# Altium footprint library LHAC-4XDSP2XV7-VP5_0226_3.PcbLib: 96 footprints (part 11 of 12)
Each footprint in its own frame and in the unit in brackets; x right, y up, seen from the top. Pads: shape width x height; smd on the part's side, far side on the other; paste and mask are expansions set on the pad; w line width, h text height; cw(c..) or ccw(c..) is an arc to the next point about the centre after c.
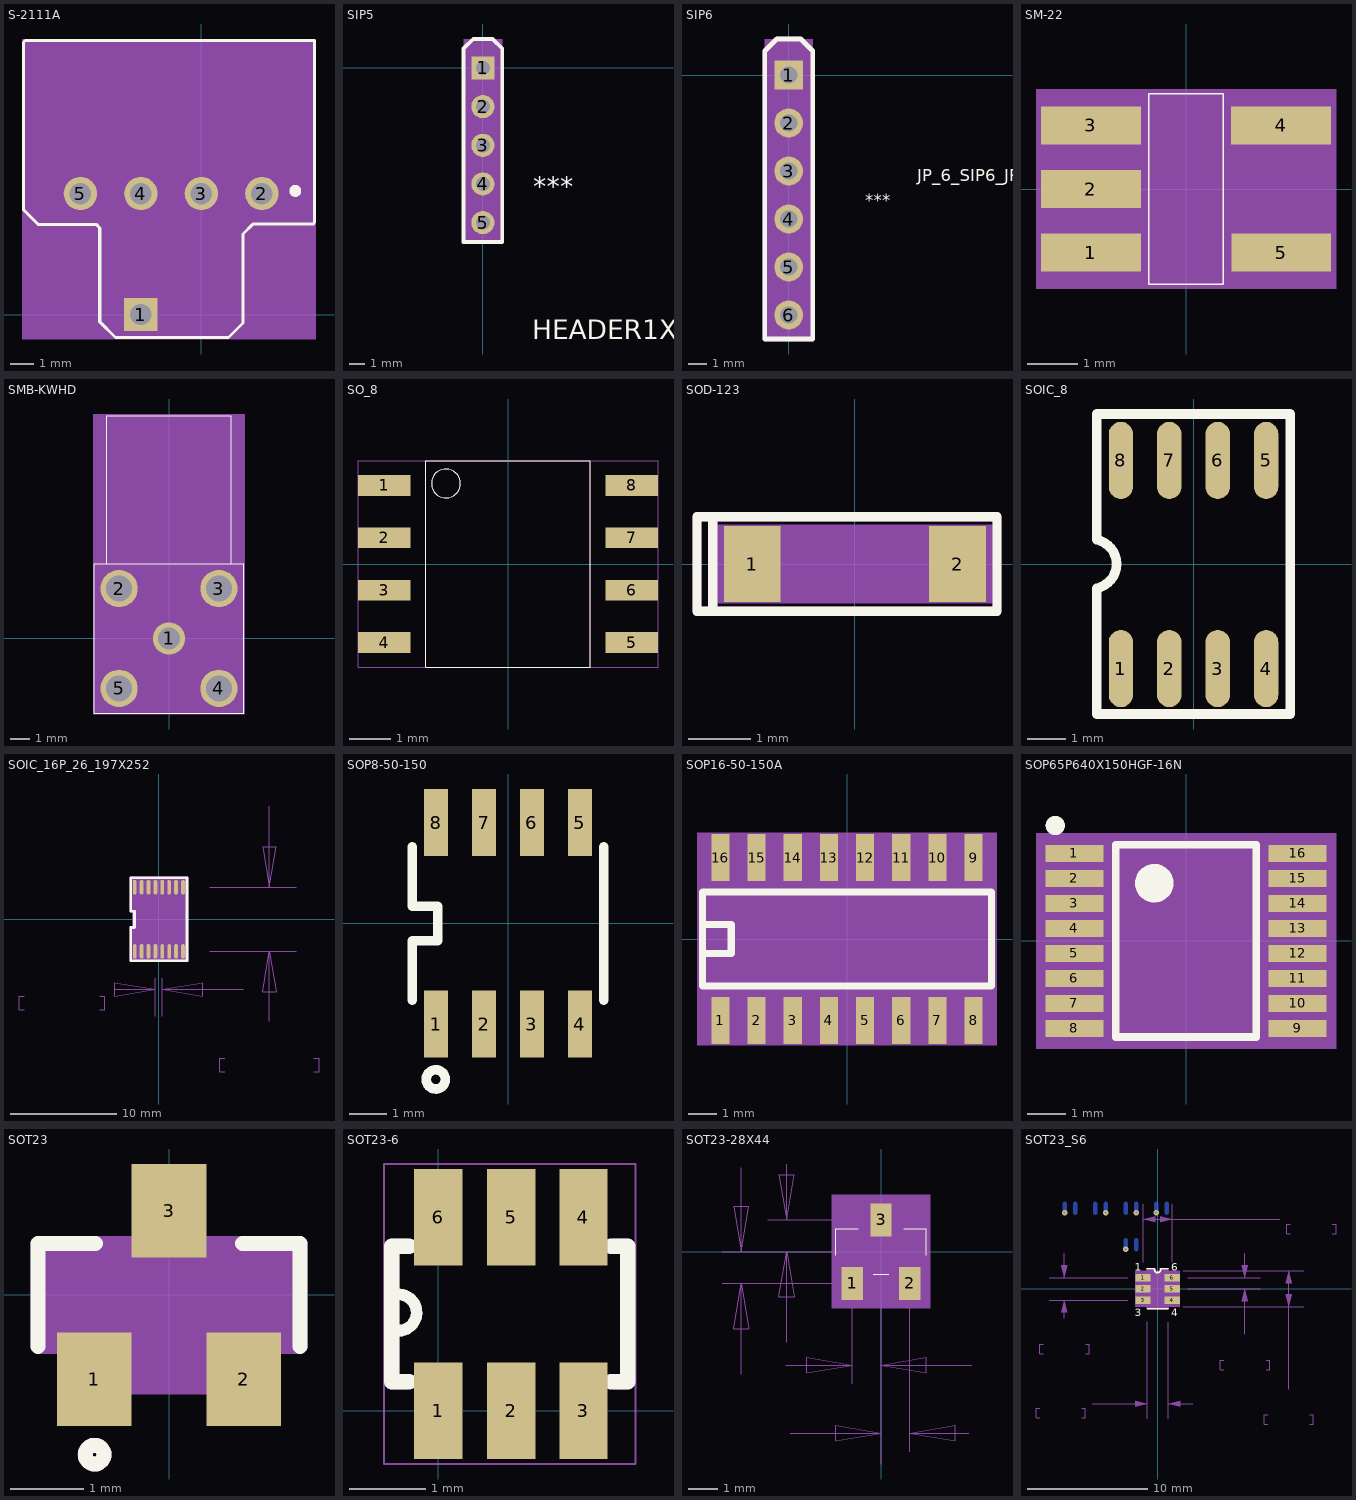
[diagram p10: the footprints below, top view; thin cyan lines are the x and y axes]

## S-2111A [mil] "S-2111A"
pads (5):
  rect 55.12x55.12 hole 35.43: 1(-100,0)
  round 55.12 hole 35.43: 2(100,200) 3(0,200) 4(-100,200) 5(-200,200)
Top Overlay:
  circle w9.84: c155.14,204.39 r4.92
  lines w5: -294,173 -294,450 -291,453 187,453 187,152 185,150 86,150 69,133 69,-14 45,-38 -1,-38 -142,-38 -168,-12 -168,143 -174,149 -270,149 -294,173
Mechanical 5:
  circle w9.84: c155.14,204.39 r4.92
  lines w5: -294,173 -294,450 -291,453 187,453 187,152 185,150 86,150 69,133 69,-14 45,-38 -1,-38 -142,-38 -168,-12 -168,143 -174,149 -270,149 -294,173
  text "U41" at 112.55,39.84 h25
  text "S2111A_S-2111A_S-2011A" at -65,536 h25
Mechanical 14:
  text "3" at 0,210 h25
  text "5" at -200,210 h25
  text "2" at 100,210 h25
  text "1" at -100,10 h25
  text "4" at -100,210 h25
Mechanical 16:
  circle w3.94: c-200,200 r27.56
  circle w3.94: c-100,200 r27.56
  circle w3.94: c0,200 r27.56
  circle w3.94: c100,200 r27.56
  circle w1.97: c0,0 r13.78
  region: -296.5,-40.5 189.5,-40.5 189.5,455.5 -296.5,455.5
  lines w1.97: -19.69,0 19.69,0 ; 0,-19.69 0,19.69
  lines w3.94: -127.56,-27.56 -127.56,27.56 -72.44,27.56 -72.44,-27.56 -127.56,-27.56
Mechanical 17:
  text ".Designator" at -70.17,237.5 h25
3D body: height 150, standoff 0, extent -296.5,-40.5 189.5,455.5

## SIP5 [mil] "SIP5"
pads (5):
  rect 60x60 / inner rect 55x55 / far side rect 60x60 hole 36: 1(0,0)
  round 60 / inner round 55 / far side round 60 hole 36: 2(0,-100) 3(0,-200) 4(0,-300) 5(0,-400)
Top Overlay:
  lines w10: -50,-450 -50,50 -25,75 25,75 50,50 50,-450 -50,-450
  text ".Designator" at 97.5,-242.5 h25
  text "HEADER1X5_SIP5_HEADER1X5" at 128,-701 h50
  text "***" at 130,-332 h50
Mechanical 14:
  text "4" at 0,-324.8 h31
  text "2" at 0,-124.8 h31
  text "3" at 0,-224.8 h31
  text "1" at 0,-24.8 h31
  text "5" at 0,-424.8 h31
Mechanical 16:
  region: -50,-450 50,-450 50,75 -50,75
  lines w1: -50,-450 -50,50 -25,75 25,75 50,50 50,-450 -50,-450
Mechanical 17:
  text "***" at -21,-507 h50
3D body: height 150, standoff 0, extent -50,-450 50,75

## SIP6 [mil] "SIP6"
pads (6):
  rect 60x60 / inner rect 55x55 / far side rect 60x60 hole 36: 1(0,0)
  round 60 / inner round 55 / far side round 60 hole 36: 2(0,-100) 3(0,-200) 4(0,-300) 5(0,-400) 6(0,-500)
Top Overlay:
  lines w10: -50,-550 50,-550 50,50 25,75 -25,75 -50,50 -50,-550
  text "***" at 160,-272 h25
  text "JP_6_SIP6_JP_6" at 268,-221 h25
  text ".Designator" at 25,-570 h25
Mechanical 5:
  lines w10: -50,-550 50,-550 50,50 25,75 -25,75 -50,50 -50,-550
  text "J5" at 25.01,-570 h25
  text "JP_6_SIP6_JP_6" at 259.66,-212.66 h25
  text "***" at 186.66,-228.66 h25
Mechanical 14:
  text "2" at 8,-100 h10
  text "1" at 8,0 h10
  text "5" at 8,-400 h10
  text "3" at 8,-200 h10
  text "6" at 8,-500 h10
  text "4" at 8,-300 h10
Mechanical 16:
  region: -50,-550 50,-550 50,75 -50,75
  lines w1: -50,-550 50,-550 50,50 25,75 -25,75 -50,50 -50,-550
Mechanical 17:
  text "***" at 9,-447 h25
3D body: height 150, standoff 0, extent -50,-550 50,75

## SM-22 [mil] "SM-22"
pads (5):
  rect 78.7x29.9 smd: 1(-74.8,-50) 2(-74.8,0) 3(-74.8,50) 4(74.8,50) 5(75,-50)
Top Overlay:
  lines w1: -29.5,-75 -29.5,75 29.5,75 29.5,-75 -29.5,-75
Mechanical 5:
  lines w1: -29.5,-75 -29.5,75 29.5,75 29.5,-75 -29.5,-75
  text "T14" at 37.85,144.45 h25
Mechanical 14:
  text "1" at -66.8,-50 h20
  text "5" at 95,-50 h25
  text "3" at -66.8,50 h20
  text "2" at -66.8,0 h20
  text "4" at 82.8,50 h20
Mechanical 16:
  region: -118.1,78.7 -118.1,-78.7 118.1,-78.7 118.1,78.7
  lines w1: -29.6,59.9 -29.4,59.9 -14.4,74.8 ; -29.5,-75 -29.5,75 29.5,75 29.5,-75 -29.5,-75
3D body: height 150, standoff 0, extent -118.1,-78.7 118.1,78.7

## SMB-KWHD [mil] "SMB-KWHD"
pads (5):
  round 65 / inner round 55 / far side round 65 hole 44: 1(0,0)
  round 75 / inner round 65 / far side round 75 hole 52: 2(-100.39,100.39) 3(100.39,100.39) 4(100.39,-100.39) 5(-100.39,-100.39)
Top Overlay:
  lines w1: -125.39,150.47 -125.39,448.03 125.39,448.03 125.39,150.47 ; -150.59,-150.59 150.59,-150.59 150.59,150.59 -150.59,150.59 -150.59,-150.59
Mechanical 5:
  lines w1: -125.39,150.47 -125.39,448.03 125.39,448.03 125.39,150.47 ; -150.59,-150.59 150.59,-150.59 150.59,150.59 -150.59,150.59 -150.59,-150.59
  text "J10" at 175.05,9.55 h25
Mechanical 14:
  text "1" at 0,28 h35
  text "2" at -100.39,128.39 h35
  text "3" at 100.39,128.39 h35
  text "4" at 100.39,-72.39 h35
  text "5" at -100.39,-72.39 h35
Mechanical 16:
  region: -151.89,-151.89 151.89,-151.89 151.89,451.42 -151.89,451.42
  lines w1: -125.39,150.47 -125.39,451.42 ; -125.39,448.03 125.39,448.03 125.39,150.47 ; -150.59,-150.59 150.59,-150.59 150.59,150.59 -150.59,150.59 -150.59,-150.59
3D body: height 150, standoff 0, extent -151.89,-151.89 151.89,451.42

## SO_8 [mm] "SO_8"
pads (8):
  rect 1.27x0.5 smd: 1(-3,1.905) 2(-3,0.635) 3(-3,-0.635) 4(-3,-1.905) 5(3,-1.905) 6(3,-0.635) 7(3,0.635) 8(3,1.905)
Top Overlay:
  circle w0.025: c-1.506,1.954 r0.351
  lines w0.025: -2,-2.5 2,-2.5 2,2.5 -2,2.5 -2,-2.5
  text ".Designator" at -1.143,2.857 h0.64
Mechanical 5:
  lines w0.025: -2,-2.5 2,-2.5 2,2.5 -2,2.5 -2,-2.5 ; -1.857,1.954 ccw(c-1.506,1.954) -1.506,1.603 ccw(c-1.506,1.954) -1.155,1.954 ccw(c-1.506,1.954) -1.506,2.305 ccw(c-1.506,1.954) -1.857,1.954
  text "U8" at 1.058,1.926 h0.64
Mechanical 14:
  text "7" at 2.797,0.635 h0.51
  text "3" at -3.203,-0.635 h0.51
  text "4" at -3.203,-1.905 h0.51
  text "5" at 2.797,-1.905 h0.51
  text "2" at -3.203,0.635 h0.51
  text "8" at 2.797,1.905 h0.51
  text "1" at -3.203,1.905 h0.51
  text "6" at 2.797,-0.635 h0.51
Mechanical 16:
  lines w0.025: -3.64,-2.5 3.64,-2.5 ; -3.64,-2.5 -3.64,2.5 ; -3.64,-2.5 3.64,-2.5 ; -3.64,-2.5 -3.64,2.5 ; -3.64,2.5 3.64,2.5 ; -3.64,2.5 3.64,2.5 ; 3.64,-2.5 3.64,2.5 ; 3.64,-2.5 3.64,2.5 ; -2,-2.5 2,-2.5 2,2.5 -2,2.5 -2,-2.5

## SOD-123 [mil] "SOD-123"
pads (2):
  rect 36x48 smd: 1(-65,0) 2(65,0)
Top Overlay:
  lines w6: -90,-30 -90,30 ; -90,-30 90,-30 90,30 -90,30 ; -90,-30 -100,-30 -100,30 -90,30
Mechanical 5:
  lines w6: -90,-30 -100,-30 -100,30 -90,30 ; -90,-30 90,-30 90,30 -90,30 ; -90,-30 -90,30
  text "D1" at -142.5,17.5 h25
Mechanical 14:
  text "2" at 65,10 h25
  text "1" at -65,10 h25
Mechanical 16:
  region: -89,-25 89,-25 89,25 -89,25
  lines w1: -89,-18 89,-18 89,18 -89,18 -89,-18
Mechanical 17:
  text "MBR0530" at -100,-100 h60
3D body: height 150, standoff 0, extent -89,-25 89,25

## SOIC_8 [mil] "SOIC_8"
pads (8):
  oval 25.2x79.9 smd: 1(-75,-107.5) 2(-25,-107.5) 3(25,-107.5) 4(75,-107.5) 5(75,107.5) 6(25,107.5) 7(-25,107.5) 8(-75,107.5)
Top Overlay:
  lines w10: -100,-154.5 -100,-24.5 ccw(c-105.01,0.5) -100,25.5 -100,155.5 100,155.5 100,-154.5 -100,-154.5
Mechanical 17:
  text ".Designator" at -130,-220 h25

## SOIC_16P_26_197X252 [mil] "SOIC_16P_26_197X252"
pads (16):
  oval 14x54 smd: 1(-89.57,-118.98) 2(-63.98,-118.98) 3(-38.39,-118.98) 4(-12.8,-118.98) 5(12.8,-118.98) 6(38.39,-118.98) 7(63.98,-118.98) 8(89.57,-118.98) 9(89.57,118.98) 10(63.98,118.98) 11(38.39,118.98) 12(12.8,118.98) 13(-12.8,118.98) 14(-38.39,118.98) 15(-63.98,118.98) 16(-89.57,118.98)
Top Overlay:
  lines w10: -104.57,-153.98 -104.57,-30 -90,-30 -90,30 -104.57,30 -104.57,153.98 94.57,153.98 104.57,153.98 104.57,-143.98 104.57,-153.98 -94.57,-153.98 -104.57,-153.98
  text ".Designator" at 162.5,-12.5 h25
Mechanical 5:
  lines w10: -104.57,-153.98 -104.57,-30 -90,-30 -90,30 -104.57,30 -104.57,153.98 94.57,153.98 104.57,153.98 104.57,-143.98 104.57,-153.98 -94.57,-153.98 -104.57,-153.98
  text "U69" at 162.5,-12.5 h25
Mechanical 13:
  lines w1: -500,-335 -519,-335 -519,-285 -500,-285 ; -220,-335 -201,-335 -201,-285 -220,-285 ; -163.5,-260 -12.8,-260 ; -12.8,-360 -12.8,-218.98 ; 12.8,-360 12.8,-218.98 ; 189.57,-118.98 510,-118.98 ; 189.57,118.98 510,118.98 ; 244.5,-565 225.5,-565 225.5,-515 244.5,-515 ; 312.8,-260 12.8,-260 ; 410,-377.5 410,-118.98 ; 410,418.98 410,118.98 ; 575.5,-565 594.5,-565 594.5,-515 575.5,-515 ; -12.8,-260 -162.8,-235 -162.8,-285 -12.8,-260 ; 12.8,-260 162.8,-285 162.8,-235 12.8,-260 ; 410,-118.98 385,-268.98 435,-268.98 410,-118.98 ; 410,118.98 435,268.98 385,268.98 410,118.98
  text "237.97" at 263.5,-565 h36
  text "6.04" at 314.5,-465 h36
  text "25.59" at -481,-335 h36
  text "0.65" at -455.5,-235 h36
Mechanical 14:
  text "15" at -41.58,118.98 h28
  text "14" at -15.99,118.98 h28
  text "3" at -27.19,-118.98 h28
  text "2" at -52.78,-118.98 h28
  text "9" at 100.77,118.98 h28
  text "8" at 100.77,-118.98 h28
  text "1" at -78.37,-118.98 h28
  text "5" at 24,-118.98 h28
  text "4" at -1.6,-118.98 h28
  text "7" at 75.18,-118.98 h28
  text "6" at 49.59,-118.98 h28
  text "13" at 9.6,118.98 h28
  text "12" at 35.2,118.98 h28
  text "11" at 60.79,118.98 h28
  text "10" at 86.38,118.98 h28
  text "16" at -67.17,118.98 h28
Mechanical 16:
  region: -96.65,-125.91 -96.65,-86.61 -98.43,-86.61 -98.43,86.61 -96.65,86.61 -96.65,125.91 -82.48,125.91 -82.48,86.61 -71.06,86.61 -71.06,125.91 -56.89,125.91 -56.89,86.61 -45.47,86.61 -45.47,125.91 -31.3,125.91 -31.3,86.61 -19.88,86.61 -19.88,125.91 -5.71,125.91 -5.71,86.61 5.71,86.61 5.71,125.91 19.88,125.91 19.88,86.61 31.3,86.61 31.3,125.91 45.47,125.91 45.47,86.61 56.89,86.61 56.89,125.91 71.06,125.91 71.06,86.61 82.48,86.61 82.48,125.91 96.65,125.91 96.65,86.61 98.43,86.61 98.43,-86.61 96.65,-86.61 96.65,-125.91 82.48,-125.91 82.48,-86.61 71.06,-86.61 71.06,-125.91 56.89,-125.91 56.89,-86.61 45.47,-86.61 45.47,-125.91 31.3,-125.91 31.3,-86.61 19.88,-86.61 19.88,-125.91 5.71,-125.91 5.71,-86.61 -5.71,-86.61 -5.71,-125.91 -19.88,-125.91 -19.88,-86.61 -31.3,-86.61 -31.3,-125.91 -45.47,-125.91 -45.47,-86.61 -56.89,-86.61 -56.89,-125.91 -71.06,-125.91 -71.06,-86.61 -82.48,-86.61 -82.48,-125.91
  pour cut-out: -104.57,153.98 104.57,153.98 104.57,-153.98 -104.57,-153.98 -104.57,-30 -90,-30 -90,30 -104.57,30
3D body: height 150, standoff 0, extent -98.43,-125.91 98.43,125.91

## SOP8-50-150 [mil] "SOP8-50-150"
pads (8):
  rect 25x70 smd: 1(-75,-105) 2(-25,-105) 3(25,-105) 4(75,-105) 5(75,105) 6(25,105) 7(-25,105) 8(-75,105)
Top Overlay:
  circle w10: c-75.23,-162.68 r9.99
  lines w10: -100,-80 -100,-18 -73.09,-18 -73.09,18 -100,18 -100,80 ; 100,-80 100,80

## SOP16-50-150A [mil] "SOP16-50-150A"
pads (16):
  rect 25x65 smd: 1(-175,-112.5) 2(-125,-112.5) 3(-75,-112.5) 4(-25,-112.5) 5(25,-112.5) 6(75,-112.5) 7(125,-112.5) 8(175,-112.5) 9(175,112.5) 10(125,112.5) 11(75,112.5) 12(25,112.5) 13(-25,112.5) 14(-75,112.5) 15(-125,112.5) 16(-175,112.5)
Top Overlay:
  lines w10: -200,-30 -200,30 ; -200,-65 200,-65 200,65 -200,65 -200,20 -160,20 -160,-20 -200,-20 -200,-65
Mechanical 5:
  lines w10: -200,-30 -200,30 ; -200,-65 -200,-20 -160,-20 -160,20 -200,20 -200,65 200,65 200,-65 -200,-65
  text "MAX3232E_SOP16-50-150A_MAX3232E" at -100,100 h60
  text "U82" at -212.5,-35.01 h25
Mechanical 14:
  text "15" at -125,48.5 h80
  text "16" at -175,48.5 h80
  text "9" at 175,80.5 h80
  text "10" at 125,48.5 h80
  text "5" at 25,-144.5 h80
  text "13" at -25,48.5 h80
  text "1" at -175,-144.5 h80
  text "14" at -75,48.5 h80
  text "4" at -25,-144.5 h80
  text "3" at -75,-144.5 h80
  text "7" at 125,-144.5 h80
  text "6" at 75,-144.5 h80
  text "2" at -125,-144.5 h80
  text "8" at 175,-144.5 h80
  text "11" at 75,48.5 h80
  text "12" at 25,48.5 h80
Mechanical 16:
  region: -207.5,-147 207.5,-147 207.5,147 -207.5,147
3D body: height 150, standoff 0, extent -207.5,-147 207.5,147

## SOP65P640X150HGF-16N [mil] "SOP65P640X150HGF-16N"
pads (16):
  rect 59.06x17.72 smd: 1(-114.17,89.57) 2(-114.17,63.98) 3(-114.17,38.39) 4(-114.17,12.8) 5(-114.17,-12.8) 6(-114.17,-38.39) 7(-114.17,-63.98) 8(-114.17,-89.57) 9(114.17,-89.57) 10(114.17,-63.98) 11(114.17,-38.39) 12(114.17,-12.8) 13(114.17,12.8) 14(114.17,38.39) 15(114.17,63.98) 16(114.17,89.57)
Top Overlay:
  circle w19.69: c-32.48,59.06 r9.84
  circle w9.84: c-133.86,118.11 r4.92
  lines w7.87: -71.85,-98.43 71.85,-98.43 71.85,98.43 -71.85,98.43 -71.85,-98.43
Mechanical 5:
  circle w9.84: c-133.86,118.11 r4.92
  circle w19.69: c-32.48,59.06 r9.84
  lines w7.87: -71.85,-98.43 71.85,-98.43 71.85,98.43 -71.85,98.43 -71.85,-98.43
  text "DS90LV032A_2_SOP65P640X150HGF-1" at 0,339.53 h25
  text "U46" at 63.61,151.82 h25
Mechanical 14:
  text "12" at 114.17,7.2 h25
  text "8" at -114.17,-79.57 h25
  text "4" at -114.17,22.8 h25
  text "16" at 114.17,109.57 h25
  text "1" at -114.17,99.57 h25
  text "3" at -114.17,48.39 h25
  text "5" at -114.17,-2.8 h25
  text "11" at 114.17,-18.39 h25
  text "13" at 114.17,32.8 h25
  text "10" at 114.17,-43.98 h25
  text "9" at 114.17,-79.57 h25
  text "7" at -114.17,-53.98 h25
  text "6" at -114.17,-28.39 h25
  text "15" at 114.17,83.98 h25
  text "14" at 114.17,58.39 h25
  text "2" at -114.17,73.98 h25
Mechanical 16:
  circle w1.97: c0,0 r13.78
  circle w3.94: c-47.24,59.06 r19.69
  region: -153.54,-110.24 -153.54,110.24 153.54,110.24 153.54,-110.24
  pour cut-out: -153.54,-110.24 -153.54,110.24 153.54,110.24 153.54,-110.24
  lines w1.97: -19.69,0 19.69,0 ; 0,-19.69 0,19.69
  lines w3.94: -86.61,-98.43 86.61,-98.43 86.61,98.43 -86.61,98.43 -86.61,-98.43
Mechanical 17:
  text ".Designator" at 16.67,30 h25
3D body: height 150, standoff 0, extent -153.54,-110.24 153.54,110.24

## SOT23 [mil] "SOT23"
pads (3):
  rect 40x50 smd: 1(-40,-45) 2(40,-45) 3(0,45)
Top Overlay:
  circle w8: c-39.8,-85.4 r5
  lines w8: -70,-27.6 -70,27.6 -39.4,27.6 ; 39.4,27.6 70,27.6 70,-27.6
Mechanical 5:
  lines w8: -70,-27.6 -70,27.6 -39.4,27.6 ; 39.4,27.6 70,27.6 70,-27.6 ; -44.8,-85.4 cw(c-39.8,-85.4) -39.8,-80.4 cw(c-39.8,-85.4) -34.8,-85.4 cw(c-39.8,-85.4) -39.8,-90.4 cw(c-39.8,-85.4) -44.8,-85.4
  text "U16" at 117.51,67.5 h25
  text "REF3025AIDDBZT_1_SOT23_REF3012A" at -85.3,157.4 h60
Mechanical 14:
  text "3" at 0,38.7 h15.75
  text "1" at -40,-51.3 h15.75
  text "2" at 40,-51.3 h15.75
Mechanical 16:
  region: -49.2,-49.2 -49.2,-27.6 -70,-27.6 -70,27.6 -11.8,27.6 -11.8,49.2 11.8,49.2 11.8,27.6 70,27.6 70,-27.6 49.2,-27.6 49.2,-49.2
  lines w8: -70,-27.6 -49.2,-27.6 -49.2,-49.2 49.2,-49.2 49.2,-27.6 70,-27.6 70,27.6 11.8,27.6 11.8,49.2 -11.8,49.2 -11.8,27.6 -70,27.6 -70,-27.6
3D body: height 150, standoff 0, extent -70,-49.2 70,49.2

## SOT23-6 [mil] "SOT23-6"
pads (6):
  rect 25x50 smd: 1(0,0) 2(37.6,0) 3(75,0) 4(75,100) 5(37.6,100) 6(0,100)
Top Overlay:
  lines w6: -25,59 cw(c-20.58,50.73) -24,42
  lines w8: -15,15 -24,15 -24,85 -15,85 ; 30,105 45,105 ; 89,15 98,15 98,85 89,85
Mechanical 5:
  lines w6: -25,59 cw(c-20.58,50.73) -24,42
  lines w8: -16.5,15 -24,15 -24,85 -16.5,85 ; 91.5,15 98,15 98,85 91.5,85
  text "U32" at -110.51,27.5 h25
Mechanical 14:
  text "2" at 27.6,0 h25
  text "6" at -10,100 h25
  text "5" at 27.6,100 h25
  text "3" at 65,0 h25
  text "4" at 65,100 h25
  text "1" at -10,0 h25
Mechanical 16:
  lines w1: -28,-27.5 -28,127.5 102,127.5 102,-27.5 -28,-27.5
Mechanical 17:
  text ".Designator" at 0,200 h25

## SOT23-28X44 [mil] "SOT23-28X44"
pads (3):
  rect 28x44 smd: 1(-38,-42) 2(38,-42) 3(0,42)
Top Overlay:
  lines w1: -60,-5 -60,30 -30,30 ; -10,-30 10,-30 ; 30,30 60,30 60,-5
Mechanical 14:
  text "1" at -38,-32 h25
  text "2" at 38,-32 h25
  text "3" at 0,52 h25
Mechanical 16:
  region: -65,-75 65,-75 65,75 -65,75
  lines w1: -210,-42 -63,-42 ; -210,0 -120,0 ; -185,-162 -185,-42 ; -185,111 -185,0 ; -181,0 -25,0 ; -150,0 -135,0 ; -150,42 -25,42 ; -130,0 -105,0 ; -126,-150 -38,-150 ; -125,-120 -125,0 ; -125,116 -125,42 ; -120,-240 0,-240 ; -60,-10 -60,30 ; -38,-175 -38,-67 ; -30,30 -60,30 ; -10,-30 10,-30 ; 0,-281 0,-25 ; 0,-265 0,-75 ; 0,-175 0,-90 ; 30,30 60,30 ; 38,-265 38,-67 ; 60,-10 60,30 ; 116,-240 38,-240 ; 120,-150 0,-150 ; -185,-42 -175,-102 -195,-102 -185,-42 ; -185,0 -195,60 -175,60 -185,0 ; -125,0 -115,-60 -135,-60 -125,0 ; -125,42 -135,102 -115,102 -125,42 ; -60,30 -60,-30 60,-30 60,30 ; -60,30 60,30 ; -38,-150 -98,-160 -98,-140 -38,-150 ; 0,-240 -60,-250 -60,-230 0,-240 ; 0,-150 60,-140 60,-160 0,-150 ; 38,-240 98,-230 98,-250 38,-240
Multi-Layer:
  region: -20,20 20,20 20,-65 -20,-65
Mechanical 20:
  text ".Designator" at -85,-11.67 h35
  text "REF3025AIDBZ" at -20,5 h35
  text "X" at 15,5 h35
  text "X" at 50,5 h35
Mechanical 28:
  text "PAD 28X44REC" at -280,-475 h35
  text "SM  36X50REC" at -280,-540 h35
  text "SP  28X44REC" at -280,-615 h35
  text "SOT23-28X44" at -240,385 h35
  text ".038" at 150,-260 h35
  text ".038" at -350,-170 h35
  text ".042" at -165,145 h35
  text ".042" at -105,150 h35
  text "0" at -20,-355 h35
  text "0" at -255,-20 h35
3D body: height 150, standoff 0, extent -65,-75 65,75

## SOT23_S6 [mil] "SOT23_S6"
pads (6):
  rect 50x25 smd: 1(-48,37) 2(-48,0) 3(-48,-37) 4(48,-37) 5(48,0) 6(48,37)
via -305,250 diameter 18 hole 10
via -170,250 diameter 18 hole 10
via -105,130 diameter 18 hole 10
via -70,250 diameter 18 hole 10
via -5,250 diameter 18 hole 10
Bottom Layer:
  lines w15: -305,250 -305,280 ; -270,250 -270,280 ; -205,250 -205,280 ; -170,250 -170,280 ; -105,130 -105,160 ; -105,250 -105,280 ; -70,130 -70,160 ; -70,250 -70,280 ; -5,250 -5,280 ; 30,250 30,280
Top Overlay:
  lines w6: -34.5,66 -10,66 ; -34,-65 34,-65 ; -10,65 ccw(c-0.21,63.22) -0.21,53.27 ccw(c-0.21,63.58) 10,65 9.79,65.27 ; 10,66 34.5,66
  text ".Designator" at 90.05,29.84 h25
  text "1" at -75,60 h25
  text "3" at -75,-90 h25
  text "4" at 45,-90 h25
  text "6" at 45,60 h25
Mechanical 5:
  lines w6: -34.5,66 -10,66 ; -34,-65 34,-65 ; -10,65 ccw(c-0.21,63.22) -0.21,53.27 ccw(c-0.21,63.58) 10,65 9.79,65.27 ; 10,66 34.5,66
  text "6" at 45,60 h25
  text "4" at 45,-90 h25
  text "3" at -75,-90 h25
  text "1" at -75,60 h25
  text "U42" at 90.05,29.84 h25
Mechanical 14:
  text "5" at 48,4 h10
  text "1" at -48,41 h10
  text "4" at 48,-33 h10
  text "6" at 48,41 h10
  text "3" at -48,-33 h10
  text "2" at -48,4 h10
Mechanical 16:
  pour cut-out: 276,77 286,37 296,77
  pour cut-out: 296,-40 286,0 276,-40
  pour cut-out: 440,19 430,59 420,19
  pour cut-out: 420,-18 430,-58 440,-18
  pour cut-out: -316,77 -306,37 -296,77
  pour cut-out: -296,-77 -306,-37 -316,-77
  pour cut-out: 8,218 48,228 8,238
  pour cut-out: -8,238 -48,228 -8,218
  pour cut-out: 74.5,-366 34.5,-376 74.5,-386
  pour cut-out: -74,-386 -34,-376 -74,-366
  pour cut-out: -73.06,-58.96 73,-58.96 73,58.98 -73.06,58.98
  region: -73,-58.96 73,-58.96 73,58.98 -73,58.98
  lines w1: -387.5,-422.5 -399,-422.5 -399,-391.5 -387.5,-391.5 ; -375.5,-212.5 -387,-212.5 -387,-181.5 -375.5,-181.5 ; -356,-37 -98,-37 ; -356,37 -98,37 ; -306,-96.25 -306,-37 ; -306,37 -306,117 ; -248.5,-422.5 -237,-422.5 -237,-391.5 -248.5,-391.5 ; -236.5,-212.5 -225,-212.5 -225,-181.5 -236.5,-181.5 ; -213.75,-376 -34,-376 ; -48,87 -48,278 ; -48,228 48,228 399.75,228 ; -34,-426 -34,-108 ; 34.5,-426 34.5,-109 ; 34.5,-376 114.5,-376 ; 48,87 48,278 ; 84,-58 480,-58 ; 84.5,59 480,59 ; 98,0 336,0 ; 98,37 336,37 ; 216.5,-264.5 205,-264.5 205,-233.5 216.5,-233.5 ; 286,-148.25 286,0 ; 286,37 286,117 ; 355.5,-264.5 367,-264.5 367,-233.5 355.5,-233.5 ; 360.5,-444.5 349,-444.5 349,-413.5 360.5,-413.5 ; 430,-328.25 430,-58 430,59 ; 434.5,181.5 423,181.5 423,212.5 434.5,212.5 ; 499.5,-444.5 511,-444.5 511,-413.5 499.5,-413.5 ; 573.5,181.5 585,181.5 585,212.5 573.5,212.5
  lines w6: -10,58 ccw(c-0.21,56.22) -0.21,46.27 ccw(c-0.21,56.58) 10,58 9.79,58.27 ; -10,59 -34.5,59 -34.5,-59 34.5,-59 34.5,59 10,59
Mechanical 17:
  text "1" at -75,60 h25
  text "3" at -75,-90 h25
  text "4" at 45,-90 h25
  text "6" at 45,60 h25
Mechanical 32:
  text "padstack: R050x025S" at 0,-363.64 h31.1
  text ".037" at 228,-202.5 h31.1
  text "0.94" at 228,-264.5 h31.1
  text ".117" at 372,-382.5 h31.1
  text "2.97" at 372,-444.5 h31.1
  text ".074" at -364,-150.5 h31.1
  text "1.88" at -364,-212.5 h31.1
  text ".096" at 446,243.5 h31.1
  text "2.44" at 446,181.5 h31.1
  text ".068" at -376,-360.5 h31.1
  text "1.74" at -376,-422.5 h31.1
  text "sot23_s6" at -105,345 h31.1
  text "ALL DIMS IN INCH[MM]" at 0,-291.2 h31.1
3D body: height 150, standoff 0, extent -73,-58.96 73,58.98